# Altium footprint library Generic Footprint.PcbLib: 160 footprints (part 14 of 20)
Each footprint in its own frame and in the unit in brackets; x right, y up, seen from the top. Pads: shape width x height; smd on the part's side, far side on the other; paste and mask are expansions set on the pad; w line width, h text height; cw(c..) or ccw(c..) is an arc to the next point about the centre after c.
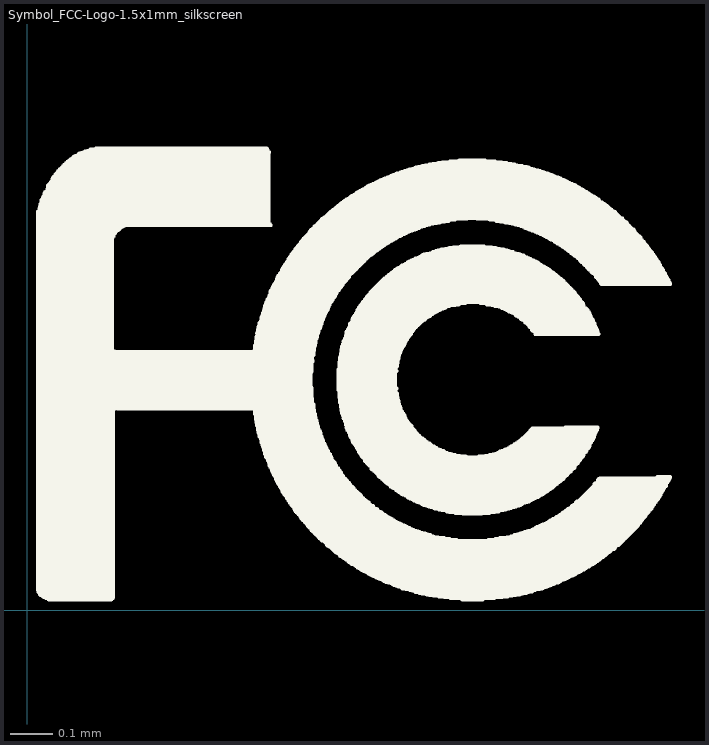
[diagram p13: the footprint, top view; thin cyan lines are the x and y axes]

## Symbol_FCC-Logo-1.5x1mm_silkscreen [mm]
pads (8620):
  round 0.01 on Top Overlay: 1(0.025,0.047) 1(0.025,0.049) 1(0.025,0.051) 1(0.025,0.053) 1(0.025,0.054) 1(0.025,0.056) 1(0.025,0.058) 1(0.025,0.059) 1(0.025,0.061) 1(0.025,0.063) 1(0.025,0.065) 1(0.025,0.066) 1(0.025,0.068) 1(0.025,0.07) 1(0.025,0.071) 1(0.025,0.073) 1(0.025,0.075) 1(0.025,0.076) 1(0.025,0.078) 1(0.025,0.08) 1(0.025,0.082) 1(0.025,0.083) 1(0.025,0.085) 1(0.025,0.087) 1(0.025,0.088) 1(0.025,0.09) 1(0.025,0.092) 1(0.025,0.093) 1(0.025,0.095) 1(0.025,0.097) 1(0.025,0.099) 1(0.025,0.1) 1(0.025,0.102) 1(0.025,0.104) 1(0.025,0.105) 1(0.025,0.107) 1(0.025,0.109) 1(0.025,0.11) 1(0.025,0.112) 1(0.025,0.114) 1(0.025,0.116) 1(0.025,0.117) 1(0.025,0.119) 1(0.025,0.121) 1(0.025,0.122) 1(0.025,0.124) 1(0.025,0.126) 1(0.025,0.127) 1(0.025,0.129) 1(0.025,0.131) 1(0.025,0.132) 1(0.025,0.134) 1(0.025,0.136) 1(0.025,0.138) 1(0.025,0.139) 1(0.025,0.141) 1(0.025,0.143) 1(0.025,0.144) 1(0.025,0.146) 1(0.025,0.148) 1(0.025,0.15) 1(0.025,0.151) 1(0.025,0.153) 1(0.025,0.155) 1(0.025,0.156) 1(0.025,0.158) 1(0.025,0.16) 1(0.025,0.161) 1(0.025,0.163) 1(0.025,0.165) 1(0.025,0.166) 1(0.025,0.168) 1(0.025,0.17) 1(0.025,0.172) 1(0.025,0.173) 1(0.025,0.175) 1(0.025,0.177) 1(0.025,0.178) 1(0.025,0.18) 1(0.025,0.182) 1(0.025,0.184) 1(0.025,0.185) 1(0.025,0.187) 1(0.025,0.189) 1(0.025,0.19) 1(0.025,0.192) 1(0.025,0.194) 1(0.025,0.195) 1(0.025,0.197) 1(0.025,0.199) 1(0.025,0.201) 1(0.025,0.202) 1(0.025,0.204) 1(0.025,0.206) 1(0.025,0.207) 1(0.025,0.209) 1(0.025,0.211) 1(0.025,0.212) 1(0.025,0.214) 1(0.025,0.216) 1(0.025,0.218) 1(0.025,0.219) 1(0.025,0.221) 1(0.025,0.223) 1(0.025,0.224) 1(0.025,0.226) 1(0.025,0.228) 1(0.025,0.229) 1(0.025,0.231) 1(0.025,0.233) 1(0.025,0.235) 1(0.025,0.236) 1(0.025,0.238) 1(0.025,0.24) 1(0.025,0.241) 1(0.025,0.243) 1(0.025,0.245) 1(0.025,0.246) 1(0.025,0.248) 1(0.025,0.25) 1(0.025,0.251) 1(0.025,0.253) 1(0.025,0.255) 1(0.025,0.257) 1(0.025,0.258) 1(0.025,0.26) 1(0.025,0.262) 1(0.025,0.263) 1(0.025,0.265) 1(0.025,0.267) 1(0.025,0.269) 1(0.025,0.27) 1(0.025,0.272) 1(0.025,0.274) 1(0.025,0.275) 1(0.025,0.277) 1(0.025,0.279) 1(0.025,0.28) 1(0.025,0.282) 1(0.025,0.284) 1(0.025,0.286) 1(0.025,0.287) 1(0.025,0.289) 1(0.025,0.291) 1(0.025,0.292) 1(0.025,0.294) 1(0.025,0.296) 1(0.025,0.297) 1(0.025,0.299) 1(0.025,0.301) 1(0.025,0.303) 1(0.025,0.304) 1(0.025,0.306) 1(0.025,0.308) 1(0.025,0.309) 1(0.025,0.311) 1(0.025,0.313) 1(0.025,0.314) 1(0.025,0.316) 1(0.025,0.318) 1(0.025,0.32) 1(0.025,0.321) 1(0.025,0.323) 1(0.025,0.325) 1(0.025,0.326) 1(0.025,0.328) 1(0.025,0.33) 1(0.025,0.331) 1(0.025,0.333) 1(0.025,0.335) 1(0.025,0.336) 1(0.025,0.338) 1(0.025,0.34) 1(0.025,0.342) 1(0.025,0.343) 1(0.025,0.345) 1(0.025,0.347) 1(0.025,0.348) 1(0.025,0.35) 1(0.025,0.352) 1(0.025,0.354) 1(0.025,0.355) 1(0.025,0.357) 1(0.025,0.359) 1(0.025,0.36) 1(0.025,0.362) 1(0.025,0.364) 1(0.025,0.365) 1(0.025,0.367) 1(0.025,0.369) 1(0.025,0.371) 1(0.025,0.372) 1(0.025,0.374) 1(0.025,0.376) 1(0.025,0.377) 1(0.025,0.379) 1(0.025,0.381) 1(0.025,0.382) 1(0.025,0.384) 1(0.025,0.386) 1(0.025,0.388) 1(0.025,0.389) 1(0.025,0.391) 1(0.025,0.393) 1(0.025,0.394) 1(0.025,0.396) 1(0.025,0.398) 1(0.025,0.399) 1(0.025,0.401) 1(0.025,0.403) 1(0.025,0.405) 1(0.025,0.406) 1(0.025,0.408) 1(0.025,0.41) 1(0.025,0.411) 1(0.025,0.413) 1(0.025,0.415) 1(0.025,0.416) 1(0.025,0.418) 1(0.025,0.42) 1(0.025,0.422) 1(0.025,0.423) 1(0.025,0.425) 1(0.025,0.427) 1(0.025,0.428) 1(0.025,0.43) 1(0.025,0.432) 1(0.025,0.433) 1(0.025,0.435) 1(0.025,0.437) 1(0.025,0.439) 1(0.025,0.44) 1(0.025,0.442) 1(0.025,0.444) 1(0.025,0.445) 1(0.025,0.447) 1(0.025,0.449) 1(0.025,0.45) 1(0.025,0.452) 1(0.025,0.454) 1(0.025,0.455) 1(0.025,0.457) 1(0.025,0.459) 1(0.025,0.461) 1(0.025,0.462) 1(0.025,0.464) 1(0.025,0.466) 1(0.025,0.467) 1(0.025,0.469) 1(0.025,0.471) 1(0.025,0.473) 1(0.025,0.474) 1(0.025,0.476) 1(0.025,0.478) 1(0.025,0.479) 1(0.025,0.481) 1(0.025,0.483) 1(0.025,0.484) 1(0.025,0.486) 1(0.025,0.488) 1(0.025,0.49) 1(0.025,0.491) 1(0.025,0.493) 1(0.025,0.495) 1(0.025,0.496) 1(0.025,0.498) 1(0.025,0.5) 1(0.025,0.501) 1(0.025,0.503) 1(0.025,0.505) 1(0.025,0.507) 1(0.025,0.508) 1(0.025,0.51) 1(0.025,0.512) 1(0.025,0.513) 1(0.025,0.515) 1(0.025,0.517) 1(0.025,0.518) 1(0.025,0.52) 1(0.025,0.522) 1(0.025,0.524) 1(0.025,0.525) 1(0.025,0.527) 1(0.025,0.529) 1(0.025,0.53) 1(0.025,0.532) 1(0.025,0.534) 1(0.025,0.535) 1(0.025,0.537) 1(0.025,0.539) 1(0.025,0.54) 1(0.025,0.542) 1(0.025,0.544) 1(0.025,0.546) 1(0.025,0.547) 1(0.025,0.549) 1(0.025,0.551) 1(0.025,0.552) 1(0.025,0.554) 1(0.025,0.556) 1(0.025,0.558) 1(0.025,0.559) 1(0.025,0.561) 1(0.025,0.563) 1(0.025,0.564) 1(0.025,0.566) 1(0.025,0.568) 1(0.025,0.569) 1(0.025,0.571) 1(0.025,0.573) 1(0.025,0.575) 1(0.025,0.576) 1(0.025,0.578) 1(0.025,0.58) 1(0.025,0.581) 1(0.025,0.583) 1(0.025,0.585) 1(0.025,0.586) 1(0.025,0.588) 1(0.025,0.59) 1(0.025,0.592) 1(0.025,0.593) 1(0.025,0.595) 1(0.025,0.597) 1(0.025,0.598) 1(0.025,0.6) 1(0.025,0.602) 1(0.025,0.603) 1(0.025,0.605) 1(0.025,0.607) 1(0.025,0.609) 1(0.025,0.61) 1(0.025,0.612) 1(0.025,0.614) 1(0.025,0.615) 1(0.025,0.617) 1(0.025,0.619) 1(0.025,0.62) 1(0.025,0.622) 1(0.025,0.624) 1(0.025,0.626) 1(0.025,0.627) 1(0.025,0.629) 1(0.025,0.631) 1(0.025,0.632) 1(0.025,0.634) 1(0.025,0.636) 1(0.025,0.637) 1(0.025,0.639) 1(0.025,0.641) 1(0.025,0.643) 1(0.025,0.644) 1(0.025,0.646) 1(0.025,0.648) 1(0.025,0.649) 1(0.025,0.651) 1(0.025,0.653) 1(0.025,0.654) 1(0.025,0.656) 1(0.025,0.658) 1(0.025,0.659) 1(0.025,0.661) 1(0.025,0.663) 1(0.025,0.665) 1(0.025,0.666) 1(0.025,0.668) 1(0.025,0.67) 1(0.025,0.671) 1(0.025,0.673) 1(0.025,0.675) 1(0.025,0.677) 1(0.025,0.678) 1(0.025,0.68) 1(0.025,0.682) 1(0.025,0.683) 1(0.025,0.685) 1(0.025,0.687) 1(0.025,0.688) 1(0.025,0.69) 1(0.025,0.692) 1(0.025,0.694) 1(0.025,0.695) 1(0.025,0.697) 1(0.025,0.699) 1(0.025,0.7) 1(0.025,0.702) 1(0.025,0.704) 1(0.025,0.705) 1(0.025,0.707) 1(0.025,0.709) 1(0.025,0.711) 1(0.025,0.712) 1(0.025,0.714) 1(0.025,0.716) 1(0.025,0.717) 1(0.025,0.719) 1(0.025,0.721) 1(0.025,0.722) 1(0.025,0.724) 1(0.025,0.726) 1(0.025,0.728) 1(0.025,0.729) 1(0.025,0.731) 1(0.025,0.733) 1(0.025,0.734) 1(0.025,0.736) 1(0.025,0.738) 1(0.025,0.739) 1(0.025,0.741) 1(0.025,0.743) 1(0.025,0.744) 1(0.025,0.746) 1(0.025,0.748) 1(0.025,0.75) 1(0.025,0.751) 1(0.025,0.753) 1(0.025,0.755) 1(0.025,0.756) 1(0.025,0.758) 1(0.025,0.76) 1(0.025,0.762) 1(0.025,0.763) 1(0.025,0.765) 1(0.025,0.767) 1(0.025,0.768) 1(0.025,0.77) 1(0.025,0.772) 1(0.025,0.773) 1(0.025,0.775) 1(0.025,0.777) 1(0.025,0.779) 1(0.025,0.78) 1(0.025,0.782) 1(0.025,0.784) 1(0.025,0.785) 1(0.025,0.787) 1(0.025,0.789) 1(0.025,0.79) 1(0.025,0.792) 1(0.025,0.794) 1(0.025,0.796) 1(0.025,0.797) 1(0.025,0.799) 1(0.025,0.801) 1(0.025,0.802) 1(0.025,0.804) 1(0.025,0.806) 1(0.025,0.807) 1(0.025,0.809) 1(0.025,0.811) 1(0.025,0.813) 1(0.025,0.814) 1(0.025,0.816) 1(0.025,0.818) 1(0.025,0.819) 1(0.025,0.821) 1(0.025,0.823) 1(0.025,0.824) 1(0.025,0.826) 1(0.025,0.828) 1(0.025,0.83) 1(0.025,0.831) 1(0.025,0.833) 1(0.025,0.835) 1(0.025,0.836) 1(0.025,0.838) 1(0.025,0.84) 1(0.025,0.841) 1(0.025,0.843) 1(0.025,0.845) 1(0.025,0.847) 1(0.025,0.848) 1(0.025,0.85) 1(0.025,0.852) 1(0.025,0.853) 1(0.025,0.855) 1(0.025,0.857) 1(0.025,0.858) 1(0.025,0.86) 1(0.025,0.862) 1(0.025,0.863) 1(0.025,0.865) 1(0.025,0.867) 1(0.025,0.869) 1(0.025,0.87) 1(0.025,0.872) 1(0.025,0.874) 1(0.025,0.875) 1(0.025,0.877) 1(0.025,0.879) 1(0.025,0.881) 1(0.025,0.882) 1(0.025,0.884) 1(0.025,0.886) 1(0.025,0.887) 1(0.025,0.889) 1(0.025,0.891) 1(0.025,0.892) 1(0.025,0.894) 1(0.025,0.896) 1(0.025,0.898) 1(0.025,0.899) 1(0.025,0.901) 1(0.025,0.903) 1(0.025,0.904) 1(0.025,0.906) 1(0.025,0.908) 1(0.025,0.909) 1(0.025,0.911) 1(0.025,0.913) 1(0.025,0.915) 1(0.025,0.916) 1(0.025,0.918) 1(0.025,0.92) 1(0.025,0.921) 1(0.025,0.923) 1(0.025,0.925) 1(0.025,0.926) 1(0.025,0.928) 1(0.025,0.93) 1(0.025,0.932) 1(0.027,0.042) 1(0.029,0.044) 1(0.029,0.051) 1(0.029,0.053) 1(0.029,0.054) 1(0.029,0.056) 1(0.029,0.058) 1(0.029,0.059) 1(0.029,0.061) 1(0.029,0.063) 1(0.029,0.065) 1(0.029,0.066) 1(0.029,0.068) 1(0.029,0.07) 1(0.029,0.071) 1(0.029,0.073) 1(0.029,0.075) 1(0.029,0.076) 1(0.029,0.078) 1(0.029,0.08) 1(0.029,0.082) 1(0.029,0.083) 1(0.029,0.085) 1(0.029,0.087) 1(0.029,0.088) 1(0.029,0.09) 1(0.029,0.092) 1(0.029,0.093) 1(0.029,0.095) 1(0.029,0.097) 1(0.029,0.099) 1(0.029,0.1) 1(0.029,0.102) 1(0.029,0.104) 1(0.029,0.105) 1(0.029,0.107) 1(0.029,0.109) 1(0.029,0.11) 1(0.029,0.112) 1(0.029,0.114) 1(0.029,0.116) 1(0.029,0.117) 1(0.029,0.119) 1(0.029,0.121) 1(0.029,0.122) 1(0.029,0.124) 1(0.029,0.126) 1(0.029,0.127) 1(0.029,0.129) 1(0.029,0.131) 1(0.029,0.132) 1(0.029,0.134) 1(0.029,0.136) 1(0.029,0.138) 1(0.029,0.139) 1(0.029,0.141) 1(0.029,0.143) 1(0.029,0.144) 1(0.029,0.146) 1(0.029,0.148) 1(0.029,0.15) 1(0.029,0.151) 1(0.029,0.153) 1(0.029,0.155) 1(0.029,0.156) 1(0.029,0.158) 1(0.029,0.16) 1(0.029,0.161) 1(0.029,0.163) 1(0.029,0.165) 1(0.029,0.166) 1(0.029,0.168) 1(0.029,0.17) 1(0.029,0.172) 1(0.029,0.173) 1(0.029,0.175) 1(0.029,0.177) 1(0.029,0.178) 1(0.029,0.18) 1(0.029,0.182) 1(0.029,0.184) 1(0.029,0.185) 1(0.029,0.187) 1(0.029,0.189) 1(0.029,0.19) 1(0.029,0.192) 1(0.029,0.194) 1(0.029,0.195) 1(0.029,0.197) 1(0.029,0.199) 1(0.029,0.201) 1(0.029,0.202) 1(0.029,0.204) 1(0.029,0.206) 1(0.029,0.207) 1(0.029,0.209) 1(0.029,0.211) 1(0.029,0.212) 1(0.029,0.214) 1(0.029,0.216) 1(0.029,0.218) 1(0.029,0.219) 1(0.029,0.221) 1(0.029,0.223) 1(0.029,0.224) 1(0.029,0.226) 1(0.029,0.228) 1(0.029,0.229) 1(0.029,0.231) 1(0.029,0.233) 1(0.029,0.235) 1(0.029,0.236) 1(0.029,0.238) 1(0.029,0.24) 1(0.029,0.241) 1(0.029,0.243) 1(0.029,0.245) 1(0.029,0.246) 1(0.029,0.248) 1(0.029,0.25) 1(0.029,0.251) 1(0.029,0.253) 1(0.029,0.255) 1(0.029,0.257) 1(0.029,0.258) 1(0.029,0.26) 1(0.029,0.262) 1(0.029,0.263) 1(0.029,0.265) 1(0.029,0.267) 1(0.029,0.269) 1(0.029,0.27) 1(0.029,0.272) 1(0.029,0.274) 1(0.029,0.275) 1(0.029,0.277) 1(0.029,0.279) 1(0.029,0.28) 1(0.029,0.282) 1(0.029,0.284) 1(0.029,0.286) 1(0.029,0.287) 1(0.029,0.289) 1(0.029,0.291) 1(0.029,0.292) 1(0.029,0.294) 1(0.029,0.296) 1(0.029,0.297) 1(0.029,0.299) 1(0.029,0.301) 1(0.029,0.303) 1(0.029,0.304) 1(0.029,0.306) 1(0.029,0.308) 1(0.029,0.309) 1(0.029,0.311) 1(0.029,0.313) 1(0.029,0.314) 1(0.029,0.316) 1(0.029,0.318) 1(0.029,0.32) 1(0.029,0.321) 1(0.029,0.323) 1(0.029,0.325) 1(0.029,0.326) 1(0.029,0.328) 1(0.029,0.33) 1(0.029,0.331) 1(0.029,0.333) 1(0.029,0.335) 1(0.029,0.336) 1(0.029,0.338) 1(0.029,0.34) 1(0.029,0.342) 1(0.029,0.343) 1(0.029,0.345) 1(0.029,0.347) 1(0.029,0.348) 1(0.029,0.35) 1(0.029,0.352) 1(0.029,0.354) 1(0.029,0.355) 1(0.029,0.357) 1(0.029,0.359) 1(0.029,0.36) 1(0.029,0.362) 1(0.029,0.364) 1(0.029,0.365) 1(0.029,0.367) 1(0.029,0.369) 1(0.029,0.371) 1(0.029,0.372) 1(0.029,0.374) 1(0.029,0.376) 1(0.029,0.377) 1(0.029,0.379) 1(0.029,0.381) 1(0.029,0.382) 1(0.029,0.384) 1(0.029,0.386) 1(0.029,0.388) 1(0.029,0.389) 1(0.029,0.391) 1(0.029,0.393) 1(0.029,0.394) 1(0.029,0.396) 1(0.029,0.398) 1(0.029,0.399) 1(0.029,0.401) 1(0.029,0.403) 1(0.029,0.405) 1(0.029,0.406) 1(0.029,0.408) 1(0.029,0.41) 1(0.029,0.411) 1(0.029,0.413) 1(0.029,0.415) 1(0.029,0.416) 1(0.029,0.418) 1(0.029,0.42) 1(0.029,0.422) 1(0.029,0.423) 1(0.029,0.425) 1(0.029,0.427) 1(0.029,0.428) 1(0.029,0.43) 1(0.029,0.432) 1(0.029,0.433) 1(0.029,0.435) 1(0.029,0.437) 1(0.029,0.439) 1(0.029,0.44) 1(0.029,0.442) 1(0.029,0.444) 1(0.029,0.445) 1(0.029,0.447) 1(0.029,0.449) 1(0.029,0.45) 1(0.029,0.452) 1(0.029,0.454) 1(0.029,0.455) 1(0.029,0.457) 1(0.029,0.459) 1(0.029,0.461) 1(0.029,0.462) 1(0.029,0.464) 1(0.029,0.466) 1(0.029,0.467) 1(0.029,0.469) 1(0.029,0.471) 1(0.029,0.473) 1(0.029,0.474) 1(0.029,0.476) 1(0.029,0.478) 1(0.029,0.479) 1(0.029,0.481) 1(0.029,0.483) 1(0.029,0.484) 1(0.029,0.486) 1(0.029,0.488) 1(0.029,0.49) 1(0.029,0.491) 1(0.029,0.493) 1(0.029,0.495) 1(0.029,0.496) 1(0.029,0.498) 1(0.029,0.5) 1(0.029,0.501) 1(0.029,0.503) 1(0.029,0.505) 1(0.029,0.507) 1(0.029,0.508) 1(0.029,0.51) 1(0.029,0.512) 1(0.029,0.513) 1(0.029,0.515) 1(0.029,0.517) 1(0.029,0.518) 1(0.029,0.52) 1(0.029,0.522) 1(0.029,0.524) 1(0.029,0.525) 1(0.029,0.527) 1(0.029,0.529) 1(0.029,0.53) 1(0.029,0.532) 1(0.029,0.534) 1(0.029,0.535) 1(0.029,0.537) 1(0.029,0.539) 1(0.029,0.54) 1(0.029,0.542) 1(0.029,0.544) 1(0.029,0.546) 1(0.029,0.547) 1(0.029,0.549) 1(0.029,0.551) 1(0.029,0.552) 1(0.029,0.554) 1(0.029,0.556) 1(0.029,0.558) 1(0.029,0.559) 1(0.029,0.561) 1(0.029,0.563) 1(0.029,0.564) 1(0.029,0.566) 1(0.029,0.568) 1(0.029,0.569) 1(0.029,0.571) 1(0.029,0.573) 1(0.029,0.575) 1(0.029,0.576) 1(0.029,0.578) 1(0.029,0.58) 1(0.029,0.581) 1(0.029,0.583) 1(0.029,0.585) 1(0.029,0.586) 1(0.029,0.588) 1(0.029,0.59) 1(0.029,0.592) 1(0.029,0.593) 1(0.029,0.595) 1(0.029,0.597) 1(0.029,0.598) 1(0.029,0.6) 1(0.029,0.602) 1(0.029,0.603) 1(0.029,0.605) 1(0.029,0.607) 1(0.029,0.609) 1(0.029,0.61) 1(0.029,0.612) 1(0.029,0.614) 1(0.029,0.615) 1(0.029,0.617) 1(0.029,0.619) 1(0.029,0.62) 1(0.029,0.622) 1(0.029,0.624) 1(0.029,0.626) 1(0.029,0.627) 1(0.029,0.629) 1(0.029,0.631) 1(0.029,0.632) 1(0.029,0.634) 1(0.029,0.636) 1(0.029,0.637) 1(0.029,0.639) 1(0.029,0.641) 1(0.029,0.643) 1(0.029,0.644) 1(0.029,0.646) 1(0.029,0.648) 1(0.029,0.649) 1(0.029,0.651) 1(0.029,0.653) 1(0.029,0.654) 1(0.029,0.656) 1(0.029,0.658) 1(0.029,0.659) 1(0.029,0.661) 1(0.029,0.663) 1(0.029,0.665) 1(0.029,0.666) 1(0.029,0.668) 1(0.029,0.67) 1(0.029,0.671) 1(0.029,0.673) 1(0.029,0.675) 1(0.029,0.677) 1(0.029,0.678) 1(0.029,0.68) 1(0.029,0.682) 1(0.029,0.683) 1(0.029,0.685) 1(0.029,0.687) 1(0.029,0.688) 1(0.029,0.69) 1(0.029,0.692) 1(0.029,0.694) 1(0.029,0.695) 1(0.029,0.697) 1(0.029,0.699) 1(0.029,0.7) 1(0.029,0.702) 1(0.029,0.704) 1(0.029,0.705) 1(0.029,0.707) 1(0.029,0.709) 1(0.029,0.711) 1(0.029,0.712) 1(0.029,0.714) 1(0.029,0.716) 1(0.029,0.717) 1(0.029,0.719) 1(0.029,0.721) 1(0.029,0.722) 1(0.029,0.724) 1(0.029,0.726) 1(0.029,0.728) 1(0.029,0.729) 1(0.029,0.731) 1(0.029,0.733) 1(0.029,0.734) 1(0.029,0.736) 1(0.029,0.738) 1(0.029,0.739) 1(0.029,0.741) 1(0.029,0.743) 1(0.029,0.744) 1(0.029,0.746) 1(0.029,0.748) 1(0.029,0.75) 1(0.029,0.751) 1(0.029,0.753) 1(0.029,0.755) 1(0.029,0.756) 1(0.029,0.758) 1(0.029,0.76) 1(0.029,0.762) 1(0.029,0.763) 1(0.029,0.765) 1(0.029,0.767) 1(0.029,0.768) 1(0.029,0.77) 1(0.029,0.772) 1(0.029,0.773) 1(0.029,0.775) 1(0.029,0.777) 1(0.029,0.779) 1(0.029,0.78) 1(0.029,0.782) 1(0.029,0.784) 1(0.029,0.785) 1(0.029,0.787) 1(0.029,0.789) 1(0.029,0.79) 1(0.029,0.792) 1(0.029,0.794) 1(0.029,0.796) 1(0.029,0.797) 1(0.029,0.799) 1(0.029,0.801) 1(0.029,0.802) 1(0.029,0.804) 1(0.029,0.806) 1(0.029,0.807) 1(0.029,0.809) 1(0.029,0.811) 1(0.029,0.813) 1(0.029,0.814) 1(0.029,0.816) 1(0.029,0.818) 1(0.029,0.819) 1(0.029,0.821) 1(0.029,0.823) 1(0.029,0.824) 1(0.029,0.826) 1(0.029,0.828) 1(0.029,0.83) 1(0.029,0.831) 1(0.029,0.833) 1(0.029,0.835) 1(0.029,0.836) 1(0.029,0.838) 1(0.029,0.84) 1(0.029,0.841) 1(0.029,0.843) 1(0.029,0.845) 1(0.029,0.847) 1(0.029,0.848) 1(0.029,0.85) 1(0.029,0.852) 1(0.029,0.853) 1(0.029,0.855) 1(0.029,0.857) 1(0.029,0.858) 1(0.029,0.86) 1(0.029,0.862) 1(0.029,0.863) 1(0.029,0.865) 1(0.029,0.867) 1(0.029,0.869) 1(0.029,0.87) 1(0.029,0.872) 1(0.029,0.874) 1(0.029,0.875) 1(0.029,0.877) 1(0.029,0.879) 1(0.029,0.881) 1(0.029,0.882) 1(0.029,0.884) 1(0.029,0.886) 1(0.029,0.887) 1(0.029,0.889) 1(0.029,0.891) 1(0.029,0.892) 1(0.029,0.894) 1(0.029,0.896) 1(0.029,0.898) 1(0.029,0.899) 1(0.029,0.901) 1(0.029,0.903) 1(0.029,0.904) 1(0.029,0.906) 1(0.029,0.908) 1(0.029,0.909) 1(0.029,0.911) 1(0.029,0.913) 1(0.029,0.915) 1(0.029,0.916) 1(0.029,0.918) 1(0.029,0.92) 1(0.029,0.921) 1(0.029,0.923) 1(0.029,0.925) 1(0.029,0.926) 1(0.029,0.928) 1(0.029,0.932) 1(0.029,0.933) 1(0.029,0.935) 1(0.029,0.937) 1(0.029,0.938) 1(0.03,0.037) 1(0.03,0.039) 1(0.03,0.042) 1(0.03,0.046) 1(0.03,0.051) 1(0.03,0.053) 1(0.03,0.054) 1(0.03,0.056) 1(0.03,0.058) 1(0.03,0.059) 1(0.03,0.061) 1(0.03,0.063) 1(0.03,0.065) 1(0.03,0.066) 1(0.03,0.068) 1(0.03,0.07) 1(0.03,0.071) 1(0.03,0.073) 1(0.03,0.075) 1(0.03,0.076) 1(0.03,0.078) 1(0.03,0.08) 1(0.03,0.082) 1(0.03,0.083) 1(0.03,0.085) 1(0.03,0.087) 1(0.03,0.088) 1(0.03,0.09) 1(0.03,0.092) 1(0.03,0.093) 1(0.03,0.095) 1(0.03,0.097) 1(0.03,0.099) 1(0.03,0.1) 1(0.03,0.102) 1(0.03,0.104) 1(0.03,0.105) 1(0.03,0.107) 1(0.03,0.109) 1(0.03,0.11) 1(0.03,0.112) 1(0.03,0.114) 1(0.03,0.116) 1(0.03,0.117) 1(0.03,0.119) 1(0.03,0.121) 1(0.03,0.122) 1(0.03,0.124) 1(0.03,0.126) 1(0.03,0.127) 1(0.03,0.129) 1(0.03,0.131) 1(0.03,0.132) 1(0.03,0.134) 1(0.03,0.136) 1(0.03,0.138) 1(0.03,0.139) 1(0.03,0.141) 1(0.03,0.143) 1(0.03,0.144) 1(0.03,0.146) 1(0.03,0.148) 1(0.03,0.15) 1(0.03,0.151) 1(0.03,0.153) 1(0.03,0.155) 1(0.03,0.156) 1(0.03,0.158) 1(0.03,0.16) 1(0.03,0.161) 1(0.03,0.163) 1(0.03,0.165) 1(0.03,0.166) 1(0.03,0.168) 1(0.03,0.17) 1(0.03,0.172) 1(0.03,0.173) 1(0.03,0.175) 1(0.03,0.177) 1(0.03,0.178) 1(0.03,0.18) 1(0.03,0.182) 1(0.03,0.184) 1(0.03,0.185) 1(0.03,0.187) 1(0.03,0.189) 1(0.03,0.19) 1(0.03,0.192) 1(0.03,0.194) 1(0.03,0.195) 1(0.03,0.197) 1(0.03,0.199) 1(0.03,0.201) 1(0.03,0.202) 1(0.03,0.204) 1(0.03,0.206) 1(0.03,0.207) 1(0.03,0.209) 1(0.03,0.211) 1(0.03,0.212) 1(0.03,0.214) 1(0.03,0.216) 1(0.03,0.218) 1(0.03,0.219) 1(0.03,0.221) 1(0.03,0.223) 1(0.03,0.224) 1(0.03,0.226) 1(0.03,0.228) 1(0.03,0.229) 1(0.03,0.231) 1(0.03,0.233) 1(0.03,0.235) 1(0.03,0.236) 1(0.03,0.238) 1(0.03,0.24) 1(0.03,0.241) 1(0.03,0.243) 1(0.03,0.245) 1(0.03,0.246) 1(0.03,0.248) 1(0.03,0.25) 1(0.03,0.251) 1(0.03,0.253) 1(0.03,0.255) 1(0.03,0.257) 1(0.03,0.258) 1(0.03,0.26) 1(0.03,0.262) 1(0.03,0.263) 1(0.03,0.265) 1(0.03,0.267) 1(0.03,0.269) 1(0.03,0.27) 1(0.03,0.272) 1(0.03,0.274) 1(0.03,0.275) 1(0.03,0.277) 1(0.03,0.279) 1(0.03,0.28) 1(0.03,0.282) 1(0.03,0.284) 1(0.03,0.286) 1(0.03,0.287) 1(0.03,0.289) 1(0.03,0.291) 1(0.03,0.292) 1(0.03,0.294) 1(0.03,0.296) 1(0.03,0.297) 1(0.03,0.299) 1(0.03,0.301) 1(0.03,0.303) 1(0.03,0.304) 1(0.03,0.306) 1(0.03,0.308) 1(0.03,0.309) 1(0.03,0.311) 1(0.03,0.313) 1(0.03,0.314) 1(0.03,0.316) 1(0.03,0.318) 1(0.03,0.32) 1(0.03,0.321) 1(0.03,0.323) 1(0.03,0.325) 1(0.03,0.326) 1(0.03,0.328) 1(0.03,0.33) 1(0.03,0.331) 1(0.03,0.333) 1(0.03,0.335) 1(0.03,0.336) 1(0.03,0.338) 1(0.03,0.34) 1(0.03,0.342) 1(0.03,0.343) 1(0.03,0.345) 1(0.03,0.347) 1(0.03,0.348) 1(0.03,0.35) 1(0.03,0.352) 1(0.03,0.354) 1(0.03,0.355) 1(0.03,0.357) 1(0.03,0.359) 1(0.03,0.36) 1(0.03,0.362) 1(0.03,0.364) 1(0.03,0.365) 1(0.03,0.367) 1(0.03,0.369) 1(0.03,0.371) 1(0.03,0.372) 1(0.03,0.374) 1(0.03,0.376) 1(0.03,0.377) 1(0.03,0.379) 1(0.03,0.381) 1(0.03,0.382) 1(0.03,0.384) 1(0.03,0.386) 1(0.03,0.388) 1(0.03,0.389) 1(0.03,0.391) 1(0.03,0.393) 1(0.03,0.394) 1(0.03,0.396) 1(0.03,0.398) 1(0.03,0.399) 1(0.03,0.401) 1(0.03,0.403) 1(0.03,0.405) 1(0.03,0.406) 1(0.03,0.408) 1(0.03,0.41) 1(0.03,0.411) 1(0.03,0.413) 1(0.03,0.415) 1(0.03,0.416) 1(0.03,0.418) 1(0.03,0.42) 1(0.03,0.422) 1(0.03,0.423) 1(0.03,0.425) 1(0.03,0.427) 1(0.03,0.428) 1(0.03,0.43) 1(0.03,0.432) 1(0.03,0.433) 1(0.03,0.435) 1(0.03,0.437) 1(0.03,0.439) 1(0.03,0.44) 1(0.03,0.442) 1(0.03,0.444) 1(0.03,0.445) 1(0.03,0.447) 1(0.03,0.449) 1(0.03,0.45) 1(0.03,0.452) 1(0.03,0.454) 1(0.03,0.455) 1(0.03,0.457) 1(0.03,0.459) 1(0.03,0.461) 1(0.03,0.462) 1(0.03,0.464) 1(0.03,0.466) 1(0.03,0.467) 1(0.03,0.469) 1(0.03,0.471) 1(0.03,0.473) 1(0.03,0.474) 1(0.03,0.476) 1(0.03,0.478) 1(0.03,0.479) 1(0.03,0.481) 1(0.03,0.483) 1(0.03,0.484) 1(0.03,0.486) 1(0.03,0.488) 1(0.03,0.49) 1(0.03,0.491) 1(0.03,0.493) 1(0.03,0.495) 1(0.03,0.496) 1(0.03,0.498) 1(0.03,0.5) 1(0.03,0.501) 1(0.03,0.503) 1(0.03,0.505) 1(0.03,0.507) 1(0.03,0.508) 1(0.03,0.51) 1(0.03,0.512) 1(0.03,0.513) 1(0.03,0.515) 1(0.03,0.517) 1(0.03,0.518) 1(0.03,0.52) 1(0.03,0.522) 1(0.03,0.524) 1(0.03,0.525) 1(0.03,0.527) 1(0.03,0.529) 1(0.03,0.53) 1(0.03,0.532) 1(0.03,0.534) 1(0.03,0.535) 1(0.03,0.537) 1(0.03,0.539) 1(0.03,0.54) 1(0.03,0.542) 1(0.03,0.544) 1(0.03,0.546) 1(0.03,0.547) 1(0.03,0.549) 1(0.03,0.551) 1(0.03,0.552) 1(0.03,0.554) 1(0.03,0.556) 1(0.03,0.558) 1(0.03,0.559) 1(0.03,0.561) 1(0.03,0.563) 1(0.03,0.564) 1(0.03,0.566) 1(0.03,0.568) 1(0.03,0.569) 1(0.03,0.571) 1(0.03,0.573) 1(0.03,0.575) 1(0.03,0.576) 1(0.03,0.578) 1(0.03,0.58) 1(0.03,0.581) 1(0.03,0.583) 